# Altium integrated library TI Power Management Battery Management.IntLib: 950 symbols (part 42 of 48)
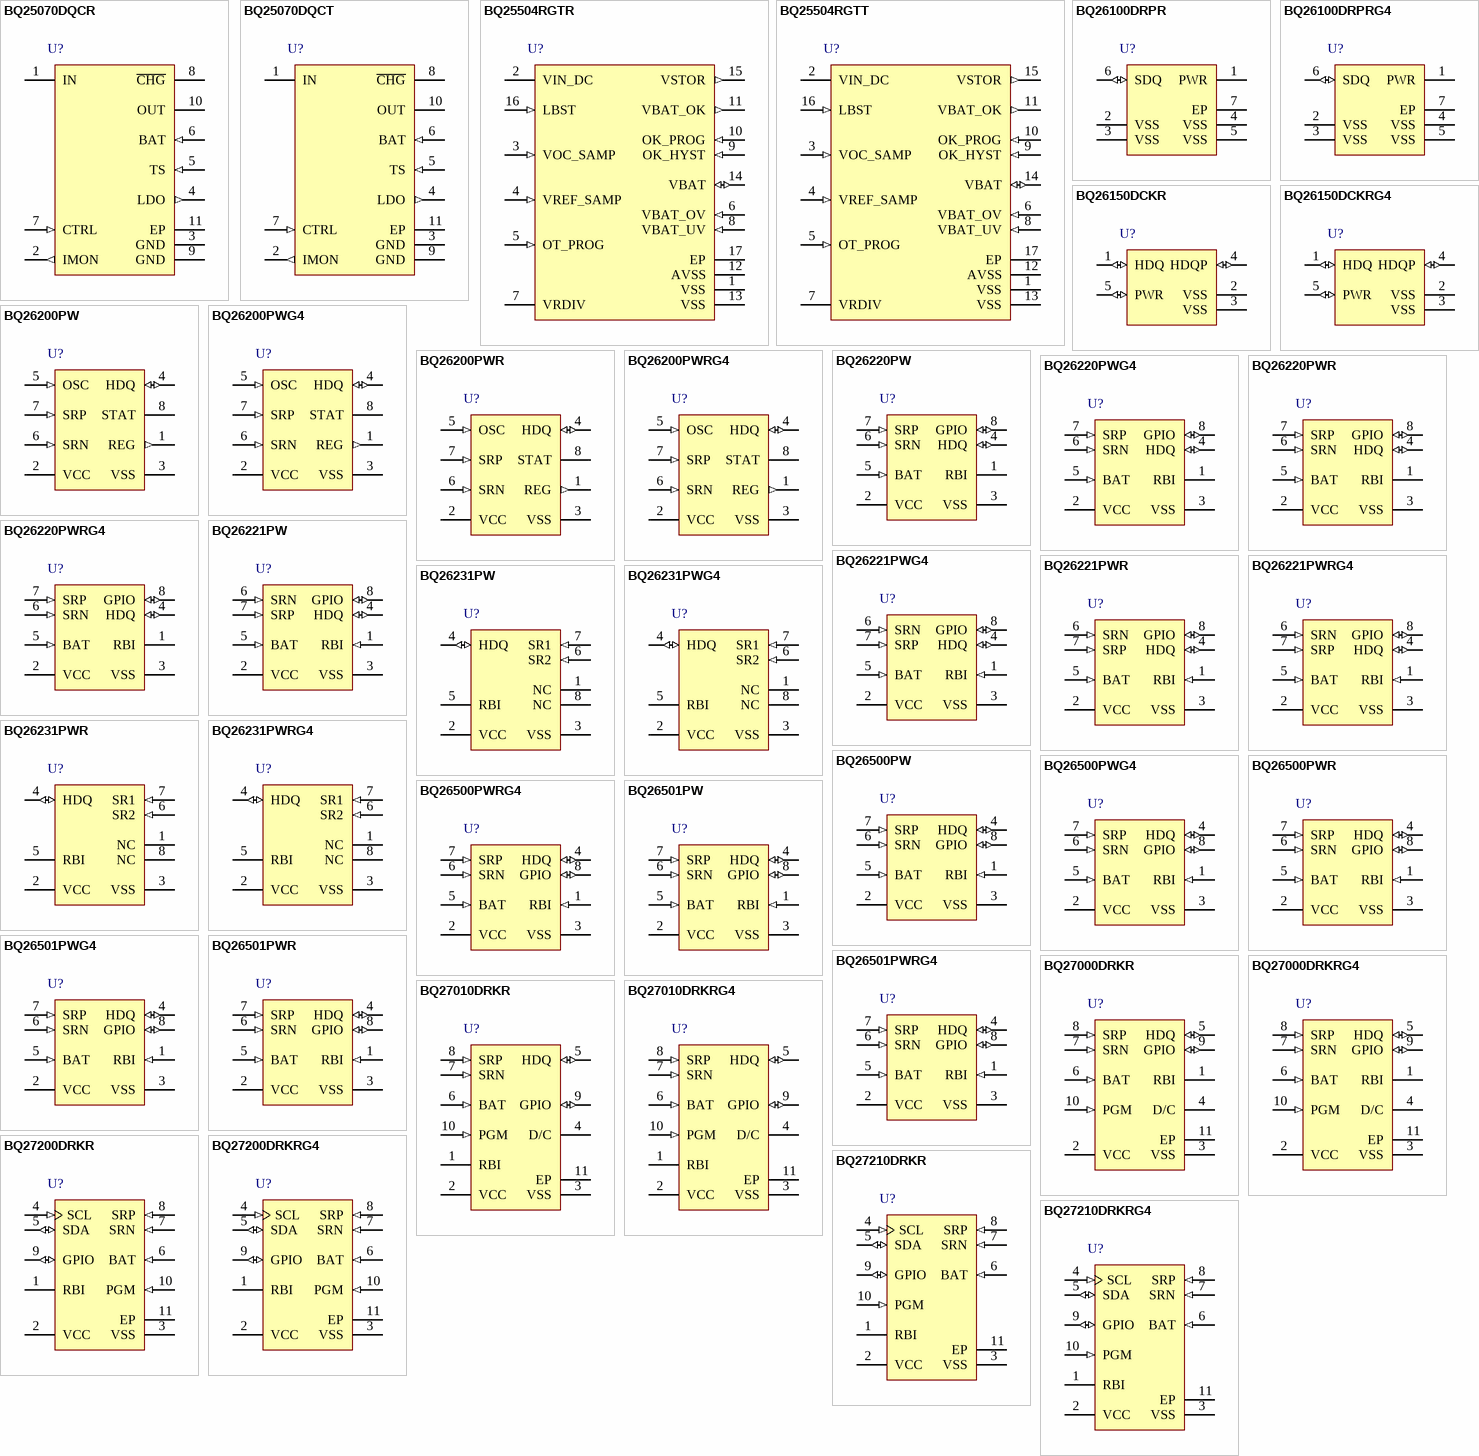
[diagram p75: symbols BQ25070DQCR to BQ27210DRKRG4]

## BQ26231PW
designator U?
Cost-Efficient Coulomb Counter for Battery Capacity Monitoring In Embedded Portable Applications, -20 to 70 degC, 8-pin TSSOP (PW), Green (RoHS & no Sb/Br); PartNumber: BQ26231PW; Manufacturer: Texas Instruments; Lead Acid: Y; Over Voltage Protection: N; SubFamily: Battery Fuel Gauge; DatasheetVersion: SLUS491; PackageVersion: revG, Feb-2011; PackageReference: PW8; PackageDescription: 8-Pin Plastic Thin Small Outline Package 3 x 4.4 mm Body ,0.65 mm Pitch; Supplier 1: Digi-Key; Supplier Part Number 1: 296-12269-5-ND; Supplier Part Number 3: 24M0809; Eco-Plan: Green (RoHS & no Sb/Br); Li-Ion: Y; Li-Polymer: Y; NiCd: Y; NiMH: Y; Mounting Technology: Surface Mount; Code_JEDEC: MO-153; ComponentLink1Description: Datasheet; ComponentLink1URL: http://www.ti.com/general/docs/lit/getliterature.tsp?genericPartNumber=BQ26231&fileType=pdf
footprint PW8_N (TSOP, 8-Leads, Body 3x4.4mm, Pitch 0.65mm, IPC Medium Density)
footprint PW8_L (TSOP, 8-Leads, Body 3x4.4mm, Pitch 0.65mm, IPC High Density)
footprint PW8_M (TSOP, 8-Leads, Body 3x4.4mm, Pitch 0.65mm, IPC Low Density)
pins: 1 NC "No connect. This pin must be left floating.", 2 VCC (power) "Supply voltage", 3 VSS (power) "Ground", 4 HDQ (io) "Single-wire HDQ interface", 5 RBI (power) "Register backup input", 6 SR2 (in) "Current sense input 1", 7 SR1 (in) "Current sense input 2", 8 NC "No connect. This pin must be left floating."

## BQ26231PWG4
designator U?
Cost-Efficient Coulomb Counter for Battery Capacity Monitoring In Embedded Portable Applications, -20 to 70 degC, 8-pin TSSOP (PW), Green (RoHS & no Sb/Br); PartNumber: BQ26231PWG4; Manufacturer: Texas Instruments; Lead Acid: Y; Over Voltage Protection: N; SubFamily: Battery Fuel Gauge; DatasheetVersion: SLUS491; PackageVersion: revG, Feb-2011; PackageReference: PW8; PackageDescription: 8-Pin Plastic Thin Small Outline Package 3 x 4.4 mm Body ,0.65 mm Pitch; Supplier 1: Digi-Key; Supplier Part Number 1: BQ26231PWG4-ND; Supplier Part Number 3: 595-BQ26231PWG4; Eco-Plan: Green (RoHS & no Sb/Br); Li-Ion: Y; Li-Polymer: Y; NiCd: Y; NiMH: Y; Mounting Technology: Surface Mount; Code_JEDEC: MO-153; ComponentLink1Description: Datasheet; ComponentLink1URL: http://www.ti.com/general/docs/lit/getliterature.tsp?genericPartNumber=BQ26231&fileType=pdf
footprint PW8_N (TSOP, 8-Leads, Body 3x4.4mm, Pitch 0.65mm, IPC Medium Density)
footprint PW8_L (TSOP, 8-Leads, Body 3x4.4mm, Pitch 0.65mm, IPC High Density)
footprint PW8_M (TSOP, 8-Leads, Body 3x4.4mm, Pitch 0.65mm, IPC Low Density)
pins: 1 NC "No connect. This pin must be left floating.", 2 VCC (power) "Supply voltage", 3 VSS (power) "Ground", 4 HDQ (io) "Single-wire HDQ interface", 5 RBI (power) "Register backup input", 6 SR2 (in) "Current sense input 1", 7 SR1 (in) "Current sense input 2", 8 NC "No connect. This pin must be left floating."

## BQ26231PWR
designator U?
Cost-Efficient Coulomb Counter for Battery Capacity Monitoring In Embedded Portable Applications, -20 to 70 degC, 8-pin TSSOP (PW), Green (RoHS & no Sb/Br); PartNumber: BQ26231PWR; Manufacturer: Texas Instruments; Lead Acid: Y; Over Voltage Protection: N; SubFamily: Battery Fuel Gauge; DatasheetVersion: SLUS491; PackageVersion: revG, Feb-2011; PackageReference: PW8; PackageDescription: 8-Pin Plastic Thin Small Outline Package 3 x 4.4 mm Body ,0.65 mm Pitch; Supplier 1: Digi-Key; Supplier Part Number 1: BQ26231PWR-ND; Supplier Part Number 3: 595-BQ26231PWR; Eco-Plan: Green (RoHS & no Sb/Br); Li-Ion: Y; Li-Polymer: Y; NiCd: Y; NiMH: Y; Mounting Technology: Surface Mount; Code_JEDEC: MO-153; ComponentLink1Description: Datasheet; ComponentLink1URL: http://www.ti.com/general/docs/lit/getliterature.tsp?genericPartNumber=BQ26231&fileType=pdf
footprint PW8_N (TSOP, 8-Leads, Body 3x4.4mm, Pitch 0.65mm, IPC Medium Density)
footprint PW8_L (TSOP, 8-Leads, Body 3x4.4mm, Pitch 0.65mm, IPC High Density)
footprint PW8_M (TSOP, 8-Leads, Body 3x4.4mm, Pitch 0.65mm, IPC Low Density)
pins: 1 NC "No connect. This pin must be left floating.", 2 VCC (power) "Supply voltage", 3 VSS (power) "Ground", 4 HDQ (io) "Single-wire HDQ interface", 5 RBI (power) "Register backup input", 6 SR2 (in) "Current sense input 1", 7 SR1 (in) "Current sense input 2", 8 NC "No connect. This pin must be left floating."

## BQ26231PWRG4
designator U?
Cost-Efficient Coulomb Counter for Battery Capacity Monitoring In Embedded Portable Applications, -20 to 70 degC, 8-pin TSSOP (PW), Green (RoHS & no Sb/Br); PartNumber: BQ26231PWRG4; Manufacturer: Texas Instruments; Lead Acid: Y; Over Voltage Protection: N; SubFamily: Battery Fuel Gauge; DatasheetVersion: SLUS491; PackageVersion: revG, Feb-2011; PackageReference: PW8; PackageDescription: 8-Pin Plastic Thin Small Outline Package 3 x 4.4 mm Body ,0.65 mm Pitch; Supplier 1: Digi-Key; Supplier Part Number 1: BQ26231PWRG4-ND; Supplier Part Number 3: 595-BQ26231PWRG4; Eco-Plan: Green (RoHS & no Sb/Br); Li-Ion: Y; Li-Polymer: Y; NiCd: Y; NiMH: Y; Mounting Technology: Surface Mount; Code_JEDEC: MO-153; ComponentLink1Description: Datasheet; ComponentLink1URL: http://www.ti.com/general/docs/lit/getliterature.tsp?genericPartNumber=BQ26231&fileType=pdf
footprint PW8_N (TSOP, 8-Leads, Body 3x4.4mm, Pitch 0.65mm, IPC Medium Density)
footprint PW8_L (TSOP, 8-Leads, Body 3x4.4mm, Pitch 0.65mm, IPC High Density)
footprint PW8_M (TSOP, 8-Leads, Body 3x4.4mm, Pitch 0.65mm, IPC Low Density)
pins: 1 NC "No connect. This pin must be left floating.", 2 VCC (power) "Supply voltage", 3 VSS (power) "Ground", 4 HDQ (io) "Single-wire HDQ interface", 5 RBI (power) "Register backup input", 6 SR2 (in) "Current sense input 1", 7 SR1 (in) "Current sense input 2", 8 NC "No connect. This pin must be left floating."

## BQ26500PW
designator U?
Complete Battery Fuel Gauge for One and Two Cell Li-Ion Applications, 0 to 70 degC, 8-pin TSSOP (PW), Green (RoHS & no Sb/Br); PartNumber: BQ26500PW; Manufacturer: Texas Instruments; Lead Acid: N; DatasheetVersion: SLUS567A; PackageVersion: revG, Feb-2011; PackageReference: PW8; PackageDescription: 8-Pin Plastic Thin Small Outline Package 3 x 4.4 mm Body ,0.65 mm Pitch; Supplier 1: Digi-Key; Supplier Part Number 1: 296-15848-5-ND; Supplier Part Number 3: 595-BQ26500PW; Eco-Plan: Green (RoHS & no Sb/Br); Li-Ion: N; Li-Polymer: N; NiCd: N; NiMH: N; Over Voltage Protection: N; SubFamily: Battery Fuel Gauge; Mounting Technology: Surface Mount; Code_JEDEC: MO-153; ComponentLink1Description: Datasheet; ComponentLink1URL: http://www.ti.com/general/docs/lit/getliterature.tsp?genericPartNumber=BQ26500&fileType=pdf
footprint PW8_N (TSOP, 8-Leads, Body 3x4.4mm, Pitch 0.65mm, IPC Medium Density)
footprint PW8_L (TSOP, 8-Leads, Body 3x4.4mm, Pitch 0.65mm, IPC High Density)
footprint PW8_M (TSOP, 8-Leads, Body 3x4.4mm, Pitch 0.65mm, IPC Low Density)
pins: 1 RBI (in) "Register back-up input", 2 VCC (power) "VCC supply input", 3 VSS (power) "Ground input", 4 HDQ (io) "Single-wire HDQ serial interface", 5 BAT (in) "Battery voltage sense input", 6 SRN (in) "Current sense input (negative)", 7 SRP (in) "Current sense input (positive)", 8 GPIO (io) "General-purpose input/output port"

## BQ26500PWG4
designator U?
Complete Battery Fuel Gauge for One and Two Cell Li-Ion Applications, 0 to 70 degC, 8-pin TSSOP (PW), Green (RoHS & no Sb/Br); PartNumber: BQ26500PWG4; Manufacturer: Texas Instruments; Lead Acid: N; DatasheetVersion: SLUS567A; PackageVersion: revG, Feb-2011; PackageReference: PW8; PackageDescription: 8-Pin Plastic Thin Small Outline Package 3 x 4.4 mm Body ,0.65 mm Pitch; Supplier 1: Digi-Key; Supplier Part Number 1: BQ26500PWG4-ND; Supplier Part Number 3: 595-BQ26500PWG4; Eco-Plan: Green (RoHS & no Sb/Br); Li-Ion: N; Li-Polymer: N; NiCd: N; NiMH: N; Over Voltage Protection: N; SubFamily: Battery Fuel Gauge; Mounting Technology: Surface Mount; Code_JEDEC: MO-153; ComponentLink1Description: Datasheet; ComponentLink1URL: http://www.ti.com/general/docs/lit/getliterature.tsp?genericPartNumber=BQ26500&fileType=pdf
footprint PW8_N (TSOP, 8-Leads, Body 3x4.4mm, Pitch 0.65mm, IPC Medium Density)
footprint PW8_L (TSOP, 8-Leads, Body 3x4.4mm, Pitch 0.65mm, IPC High Density)
footprint PW8_M (TSOP, 8-Leads, Body 3x4.4mm, Pitch 0.65mm, IPC Low Density)
pins: 1 RBI (in) "Register back-up input", 2 VCC (power) "VCC supply input", 3 VSS (power) "Ground input", 4 HDQ (io) "Single-wire HDQ serial interface", 5 BAT (in) "Battery voltage sense input", 6 SRN (in) "Current sense input (negative)", 7 SRP (in) "Current sense input (positive)", 8 GPIO (io) "General-purpose input/output port"

## BQ26500PWR
designator U?
Complete Battery Fuel Gauge for One and Two Cell Li-Ion Applications, 0 to 70 degC, 8-pin TSSOP (PW), Green (RoHS & no Sb/Br); PartNumber: BQ26500PWR; Manufacturer: Texas Instruments; Lead Acid: N; DatasheetVersion: SLUS567A; PackageVersion: revG, Feb-2011; PackageReference: PW8; PackageDescription: 8-Pin Plastic Thin Small Outline Package 3 x 4.4 mm Body ,0.65 mm Pitch; Supplier 1: Digi-Key; Supplier Part Number 1: 296-16775-2-ND; Supplier Part Number 3: 296-16775-6-ND; Eco-Plan: Green (RoHS & no Sb/Br); Li-Ion: N; Li-Polymer: N; NiCd: N; NiMH: N; Over Voltage Protection: N; SubFamily: Battery Fuel Gauge; Mounting Technology: Surface Mount; Code_JEDEC: MO-153; ComponentLink1Description: Datasheet; ComponentLink1URL: http://www.ti.com/general/docs/lit/getliterature.tsp?genericPartNumber=BQ26500&fileType=pdf
footprint PW8_N (TSOP, 8-Leads, Body 3x4.4mm, Pitch 0.65mm, IPC Medium Density)
footprint PW8_L (TSOP, 8-Leads, Body 3x4.4mm, Pitch 0.65mm, IPC High Density)
footprint PW8_M (TSOP, 8-Leads, Body 3x4.4mm, Pitch 0.65mm, IPC Low Density)
pins: 1 RBI (in) "Register back-up input", 2 VCC (power) "VCC supply input", 3 VSS (power) "Ground input", 4 HDQ (io) "Single-wire HDQ serial interface", 5 BAT (in) "Battery voltage sense input", 6 SRN (in) "Current sense input (negative)", 7 SRP (in) "Current sense input (positive)", 8 GPIO (io) "General-purpose input/output port"

## BQ26500PWRG4
designator U?
Complete Battery Fuel Gauge for One and Two Cell Li-Ion Applications, 0 to 70 degC, 8-pin TSSOP (PW), Green (RoHS & no Sb/Br); PartNumber: BQ26500PWRG4; Manufacturer: Texas Instruments; Lead Acid: N; DatasheetVersion: SLUS567A; PackageVersion: revG, Feb-2011; PackageReference: PW8; PackageDescription: 8-Pin Plastic Thin Small Outline Package 3 x 4.4 mm Body ,0.65 mm Pitch; Supplier 1: Digi-Key; Supplier Part Number 1: BQ26500PWRG4-ND; Supplier Part Number 3: 595-BQ26500PWRG4; Eco-Plan: Green (RoHS & no Sb/Br); Li-Ion: N; Li-Polymer: N; NiCd: N; NiMH: N; Over Voltage Protection: N; SubFamily: Battery Fuel Gauge; Mounting Technology: Surface Mount; Code_JEDEC: MO-153; ComponentLink1Description: Datasheet; ComponentLink1URL: http://www.ti.com/general/docs/lit/getliterature.tsp?genericPartNumber=BQ26500&fileType=pdf
footprint PW8_N (TSOP, 8-Leads, Body 3x4.4mm, Pitch 0.65mm, IPC Medium Density)
footprint PW8_L (TSOP, 8-Leads, Body 3x4.4mm, Pitch 0.65mm, IPC High Density)
footprint PW8_M (TSOP, 8-Leads, Body 3x4.4mm, Pitch 0.65mm, IPC Low Density)
pins: 1 RBI (in) "Register back-up input", 2 VCC (power) "VCC supply input", 3 VSS (power) "Ground input", 4 HDQ (io) "Single-wire HDQ serial interface", 5 BAT (in) "Battery voltage sense input", 6 SRN (in) "Current sense input (negative)", 7 SRP (in) "Current sense input (positive)", 8 GPIO (io) "General-purpose input/output port"

## BQ26501PW
designator U?
OMAP Compatible Fuel Gauge for 1 & 2 Cell Li-Ion, -20 to 70 degC, 8-pin TSSOP (PW), Green (RoHS & no Sb/Br); PartNumber: BQ26501PW; Manufacturer: Texas Instruments; Lead Acid: N; SubFamily: Battery Fuel Gauge; DatasheetVersion: SLUS586B; PackageVersion: revG, Feb-2011; PackageReference: PW8; PackageDescription: 8-Pin Plastic Thin Small Outline Package 3 x 4.4 mm Body ,0.65 mm Pitch; Supplier 1: Digi-Key; Supplier Part Number 1: 296-16925-5-ND; Supplier Part Number 3: 595-BQ26501PW; Eco-Plan: Green (RoHS & no Sb/Br); Li-Ion: N; Li-Polymer: N; NiCd: N; NiMH: N; Over Voltage Protection: N; Mounting Technology: Surface Mount; Code_JEDEC: MO-153; ComponentLink1Description: Datasheet; ComponentLink1URL: http://www.ti.com/general/docs/lit/getliterature.tsp?genericPartNumber=BQ26501&fileType=pdf
footprint PW8_N (TSOP, 8-Leads, Body 3x4.4mm, Pitch 0.65mm, IPC Medium Density)
footprint PW8_L (TSOP, 8-Leads, Body 3x4.4mm, Pitch 0.65mm, IPC High Density)
footprint PW8_M (TSOP, 8-Leads, Body 3x4.4mm, Pitch 0.65mm, IPC Low Density)
pins: 1 RBI (in) "Register back-up input", 2 VCC (power) "VCC supply input", 3 VSS (power) "Ground input", 4 HDQ (io) "Single-wire HDQ serial interface", 5 BAT (in) "Battery voltage sense input", 6 SRN (in) "Current sense input (negative)", 7 SRP (in) "Current sense input (positive)", 8 GPIO (io) "General-purpose input/output port"

## BQ26501PWG4
designator U?
OMAP Compatible Fuel Gauge for 1 & 2 Cell Li-Ion, -20 to 70 degC, 8-pin TSSOP (PW), Green (RoHS & no Sb/Br); PartNumber: BQ26501PWG4; Manufacturer: Texas Instruments; Lead Acid: N; SubFamily: Battery Fuel Gauge; DatasheetVersion: SLUS586B; PackageVersion: revG, Feb-2011; PackageReference: PW8; PackageDescription: 8-Pin Plastic Thin Small Outline Package 3 x 4.4 mm Body ,0.65 mm Pitch; Supplier 1: Digi-Key; Supplier Part Number 1: BQ26501PWG4-ND; Supplier Part Number 3: 595-BQ26501PWG4; Eco-Plan: Green (RoHS & no Sb/Br); Li-Ion: N; Li-Polymer: N; NiCd: N; NiMH: N; Over Voltage Protection: N; Mounting Technology: Surface Mount; Code_JEDEC: MO-153; ComponentLink1Description: Datasheet; ComponentLink1URL: http://www.ti.com/general/docs/lit/getliterature.tsp?genericPartNumber=BQ26501&fileType=pdf
footprint PW8_N (TSOP, 8-Leads, Body 3x4.4mm, Pitch 0.65mm, IPC Medium Density)
footprint PW8_L (TSOP, 8-Leads, Body 3x4.4mm, Pitch 0.65mm, IPC High Density)
footprint PW8_M (TSOP, 8-Leads, Body 3x4.4mm, Pitch 0.65mm, IPC Low Density)
pins: 1 RBI (in) "Register back-up input", 2 VCC (power) "VCC supply input", 3 VSS (power) "Ground input", 4 HDQ (io) "Single-wire HDQ serial interface", 5 BAT (in) "Battery voltage sense input", 6 SRN (in) "Current sense input (negative)", 7 SRP (in) "Current sense input (positive)", 8 GPIO (io) "General-purpose input/output port"

## BQ26501PWR
designator U?
OMAP Compatible Fuel Gauge for 1 & 2 Cell Li-Ion, -20 to 70 degC, 8-pin TSSOP (PW), Green (RoHS & no Sb/Br); PartNumber: BQ26501PWR; Manufacturer: Texas Instruments; Lead Acid: N; SubFamily: Battery Fuel Gauge; DatasheetVersion: SLUS586B; PackageVersion: revG, Feb-2011; PackageReference: PW8; PackageDescription: 8-Pin Plastic Thin Small Outline Package 3 x 4.4 mm Body ,0.65 mm Pitch; Supplier 1: Digi-Key; Supplier Part Number 1: 296-31471-2-ND; Supplier Part Number 3: 296-31471-6-ND; Eco-Plan: Green (RoHS & no Sb/Br); Li-Ion: N; Li-Polymer: N; NiCd: N; NiMH: N; Over Voltage Protection: N; Mounting Technology: Surface Mount; Code_JEDEC: MO-153; ComponentLink1Description: Datasheet; ComponentLink1URL: http://www.ti.com/general/docs/lit/getliterature.tsp?genericPartNumber=BQ26501&fileType=pdf
footprint PW8_N (TSOP, 8-Leads, Body 3x4.4mm, Pitch 0.65mm, IPC Medium Density)
footprint PW8_L (TSOP, 8-Leads, Body 3x4.4mm, Pitch 0.65mm, IPC High Density)
footprint PW8_M (TSOP, 8-Leads, Body 3x4.4mm, Pitch 0.65mm, IPC Low Density)
pins: 1 RBI (in) "Register back-up input", 2 VCC (power) "VCC supply input", 3 VSS (power) "Ground input", 4 HDQ (io) "Single-wire HDQ serial interface", 5 BAT (in) "Battery voltage sense input", 6 SRN (in) "Current sense input (negative)", 7 SRP (in) "Current sense input (positive)", 8 GPIO (io) "General-purpose input/output port"

## BQ26501PWRG4
designator U?
OMAP Compatible Fuel Gauge for 1 & 2 Cell Li-Ion, -20 to 70 degC, 8-pin TSSOP (PW), Green (RoHS & no Sb/Br); PartNumber: BQ26501PWRG4; Manufacturer: Texas Instruments; Lead Acid: N; SubFamily: Battery Fuel Gauge; DatasheetVersion: SLUS586B; PackageVersion: revG, Feb-2011; PackageReference: PW8; PackageDescription: 8-Pin Plastic Thin Small Outline Package 3 x 4.4 mm Body ,0.65 mm Pitch; Supplier 1: Digi-Key; Supplier Part Number 1: BQ26501PWRG4-ND; Supplier Part Number 3: 595-BQ26501PWRG4; Eco-Plan: Green (RoHS & no Sb/Br); Li-Ion: N; Li-Polymer: N; NiCd: N; NiMH: N; Over Voltage Protection: N; Mounting Technology: Surface Mount; Code_JEDEC: MO-153; ComponentLink1Description: Datasheet; ComponentLink1URL: http://www.ti.com/general/docs/lit/getliterature.tsp?genericPartNumber=BQ26501&fileType=pdf
footprint PW8_N (TSOP, 8-Leads, Body 3x4.4mm, Pitch 0.65mm, IPC Medium Density)
footprint PW8_L (TSOP, 8-Leads, Body 3x4.4mm, Pitch 0.65mm, IPC High Density)
footprint PW8_M (TSOP, 8-Leads, Body 3x4.4mm, Pitch 0.65mm, IPC Low Density)
pins: 1 RBI (in) "Register back-up input", 2 VCC (power) "VCC supply input", 3 VSS (power) "Ground input", 4 HDQ (io) "Single-wire HDQ serial interface", 5 BAT (in) "Battery voltage sense input", 6 SRN (in) "Current sense input (negative)", 7 SRP (in) "Current sense input (positive)", 8 GPIO (io) "General-purpose input/output port"

## BQ27000DRKR
designator U?
Single-Cell Li-Ion and Li-Pol Battery Gas Gauge IC, -20 to 70 degC, 10-pin VSON (DRK), Green (RoHS & no Sb/Br); PartNumber: BQ27000DRKR; Manufacturer: Texas Instruments; Lead Acid: N; Li-Ion: Y; SubFamily: Battery Fuel Gauge; DatasheetVersion: SLUS556D; PackageVersion: revD, Feb-2011; PackageReference: DRK10-2050X2650TP; PackageDescription: 10-Pin Plastic Small Outline No-Lead, 4 x 3 x 1 mm Body, 0.5 mm Pitch, Exposed Pad; Supplier 1: Digi-Key; Supplier Part Number 1: 296-17428-2-ND; Supplier Part Number 3: 296-17428-6-ND; Eco-Plan: Green (RoHS & no Sb/Br); Li-Polymer: N; NiCd: N; NiMH: N; Over Voltage Protection: N; Mounting Technology: Surface Mount; ComponentLink1Description: Datasheet; ComponentLink1URL: http://www.ti.com/general/docs/lit/getliterature.tsp?genericPartNumber=BQ27000&fileType=pdf
footprint DRK10-2050X2650TP (SON, 10-Leads, Body 4x3mm, Pitch 0.5mm, Thermal Pad 2.05x2.65mm, TI Recommended)
pins: 1 RBI (power) "Register back-up input", 2 VCC (power) "VCC supply input", 3 VSS (power) "Ground input", 4 D/C "Do not connect. Must be left floating or tied to VSS", 5 HDQ (io) "Single wire HDQ serial interface", 6 BAT (in) "Battery voltage sense input", 7 SRN (in) "Current sense input (negative)", 8 SRP (in) "Current sense input (positive)", 9 GPIO (io) "General purpose input/output", 10 PGM (in) "EEPROM programming voltage input", 11 EP (power) "Ground shield"

## BQ27000DRKRG4
designator U?
Single-Cell Li-Ion and Li-Pol Battery Gas Gauge IC, -20 to 70 degC, 10-pin VSON (DRK), Green (RoHS & no Sb/Br); PartNumber: BQ27000DRKRG4; Manufacturer: Texas Instruments; Lead Acid: N; Li-Ion: Y; SubFamily: Battery Fuel Gauge; DatasheetVersion: SLUS556D; PackageVersion: revD, Feb-2011; PackageReference: DRK10-2050X2650TP; PackageDescription: 10-Pin Plastic Small Outline No-Lead, 4 x 3 x 1 mm Body, 0.5 mm Pitch, Exposed Pad; Supplier 1: Digi-Key; Supplier Part Number 1: BQ27000DRKRG4-ND; Supplier Part Number 3: 595-BQ27000DRKRG4; Eco-Plan: Green (RoHS & no Sb/Br); Li-Polymer: N; NiCd: N; NiMH: N; Over Voltage Protection: N; Mounting Technology: Surface Mount; ComponentLink1Description: Datasheet; ComponentLink1URL: http://www.ti.com/general/docs/lit/getliterature.tsp?genericPartNumber=BQ27000&fileType=pdf
footprint DRK10-2050X2650TP (SON, 10-Leads, Body 4x3mm, Pitch 0.5mm, Thermal Pad 2.05x2.65mm, TI Recommended)
pins: 1 RBI (power) "Register back-up input", 2 VCC (power) "VCC supply input", 3 VSS (power) "Ground input", 4 D/C "Do not connect. Must be left floating or tied to VSS", 5 HDQ (io) "Single wire HDQ serial interface", 6 BAT (in) "Battery voltage sense input", 7 SRN (in) "Current sense input (negative)", 8 SRP (in) "Current sense input (positive)", 9 GPIO (io) "General purpose input/output", 10 PGM (in) "EEPROM programming voltage input", 11 EP (power) "Ground shield"

## BQ27010DRKR
designator U?
Li-Ion and Li-Pol Battery Gas Gauge IC for Portable Applications (bqJUNIOR), 10-pin VSON (DRK), Green (RoHS & no Sb/Br); PartNumber: BQ27010DRKR; Manufacturer: Texas Instruments; Lead Acid: N; Li-Ion: Y; SubFamily: Battery Fuel Gauge; DatasheetVersion: SLUS707B; PackageVersion: revD, Feb-2011; PackageReference: DRK10-2050X2650TP; PackageDescription: 10-Pin Plastic Small Outline No-Lead, 4 x 3 x 1 mm Body, 0.5 mm Pitch, Exposed Pad; Supplier 1: Digi-Key; Supplier Part Number 1: 296-20634-2-ND; Supplier Part Number 3: 296-20634-6-ND; Eco-Plan: Green (RoHS & no Sb/Br); Li-Polymer: Y; NiCd: N; NiMH: N; Over Voltage Protection: N; Mounting Technology: Surface Mount; ComponentLink1Description: Datasheet; ComponentLink1URL: http://www.ti.com/general/docs/lit/getliterature.tsp?genericPartNumber=BQ27010&fileType=pdf
footprint DRK10-2050X2650TP (SON, 10-Leads, Body 4x3mm, Pitch 0.5mm, Thermal Pad 2.05x2.65mm, TI Recommended)
pins: 1 RBI (power) "Register back-up input", 2 VCC (power) "VCC supply input", 3 VSS (power) "Ground input", 4 D/C "Do not connect. Must be left floating or tied to VSS", 5 HDQ (io) "Single wire HDQ serial interface", 6 BAT (in) "Battery voltage sense input", 7 SRN (in) "Current sense input (negative)", 8 SRP (in) "Current sense input (positive)", 9 GPIO (io) "General purpose input/output", 10 PGM (in) "EEPROM programming voltage input", 11 EP (power) "Ground shield"

## BQ27010DRKRG4
designator U?
Li-Ion and Li-Pol Battery Gas Gauge IC for Portable Applications (bqJUNIOR), 10-pin VSON (DRK), Green (RoHS & no Sb/Br); PartNumber: BQ27010DRKRG4; Manufacturer: Texas Instruments; Lead Acid: N; Li-Ion: Y; SubFamily: Battery Fuel Gauge; DatasheetVersion: SLUS707B; PackageVersion: revD, Feb-2011; PackageReference: DRK10-2050X2650TP; PackageDescription: 10-Pin Plastic Small Outline No-Lead, 4 x 3 x 1 mm Body, 0.5 mm Pitch, Exposed Pad; Supplier 1: Digi-Key; Supplier Part Number 1: BQ27010DRKRG4-ND; Supplier Part Number 3: 595-BQ27010DRKRG4; Eco-Plan: Green (RoHS & no Sb/Br); Li-Polymer: Y; NiCd: N; NiMH: N; Over Voltage Protection: N; Mounting Technology: Surface Mount; ComponentLink1Description: Datasheet; ComponentLink1URL: http://www.ti.com/general/docs/lit/getliterature.tsp?genericPartNumber=BQ27010&fileType=pdf
footprint DRK10-2050X2650TP (SON, 10-Leads, Body 4x3mm, Pitch 0.5mm, Thermal Pad 2.05x2.65mm, TI Recommended)
pins: 1 RBI (power) "Register back-up input", 2 VCC (power) "VCC supply input", 3 VSS (power) "Ground input", 4 D/C "Do not connect. Must be left floating or tied to VSS", 5 HDQ (io) "Single wire HDQ serial interface", 6 BAT (in) "Battery voltage sense input", 7 SRN (in) "Current sense input (negative)", 8 SRP (in) "Current sense input (positive)", 9 GPIO (io) "General purpose input/output", 10 PGM (in) "EEPROM programming voltage input", 11 EP (power) "Ground shield"

## BQ27200DRKR
designator U?
Single-Cell Li-Ion and Li-Pol Battery Gas Gauge IC with I2C Interface, -20 to 70 degC, 10-pin VSON (DRK), Green (RoHS & no Sb/Br); PartNumber: BQ27200DRKR; Manufacturer: Texas Instruments; Lead Acid: N; Li-Ion: Y; SubFamily: Battery Fuel Gauge; DatasheetVersion: SLUS556D; PackageVersion: revD, Feb-2011; PackageReference: DRK10-2050X2650TP; PackageDescription: 10-Pin Plastic Small Outline No-Lead, 4 x 3 x 1 mm Body, 0.5 mm Pitch, Exposed Pad; Supplier 1: Digi-Key; Supplier Part Number 1: 296-17521-2-ND; Supplier Part Number 3: 296-17521-6-ND; Eco-Plan: Green (RoHS & no Sb/Br); Li-Polymer: Y; NiCd: N; NiMH: N; Over Voltage Protection: N; Mounting Technology: Surface Mount; ComponentLink1Description: Datasheet; ComponentLink1URL: http://www.ti.com/general/docs/lit/getliterature.tsp?genericPartNumber=BQ27200&fileType=pdf
footprint DRK10-2050X2650TP (SON, 10-Leads, Body 4x3mm, Pitch 0.5mm, Thermal Pad 2.05x2.65mm, TI Recommended)
pins: 1 RBI (power) "Register back-up input", 2 VCC (power) "VCC supply input", 3 VSS (power) "Ground input", 4 SCL (in) "Serial clock input (I2C)", 5 SDA (io) "Serial data input (I2C)", 6 BAT (in) "Battery voltage sense input", 7 SRN (in) "Current sense input (negative)", 8 SRP (in) "Current sense input (positive)", 9 GPIO (io) "General purpose input/output", 10 PGM (in) "EEPROM programming voltage input", 11 EP (power) "Ground shield"

## BQ27200DRKRG4
designator U?
Single-Cell Li-Ion and Li-Pol Battery Gas Gauge IC with I2C Interface, -20 to 70 degC, 10-pin VSON (DRK), Green (RoHS & no Sb/Br); PartNumber: BQ27200DRKRG4; Manufacturer: Texas Instruments; Lead Acid: N; Li-Ion: Y; SubFamily: Battery Fuel Gauge; DatasheetVersion: SLUS556D; PackageVersion: revD, Feb-2011; PackageReference: DRK10-2050X2650TP; PackageDescription: 10-Pin Plastic Small Outline No-Lead, 4 x 3 x 1 mm Body, 0.5 mm Pitch, Exposed Pad; Supplier 1: Digi-Key; Supplier Part Number 1: BQ27200DRKRG4-ND; Supplier Part Number 3: 595-BQ27200DRKRG4; Eco-Plan: Green (RoHS & no Sb/Br); Li-Polymer: Y; NiCd: N; NiMH: N; Over Voltage Protection: N; Mounting Technology: Surface Mount; ComponentLink1Description: Datasheet; ComponentLink1URL: http://www.ti.com/general/docs/lit/getliterature.tsp?genericPartNumber=BQ27200&fileType=pdf
footprint DRK10-2050X2650TP (SON, 10-Leads, Body 4x3mm, Pitch 0.5mm, Thermal Pad 2.05x2.65mm, TI Recommended)
pins: 1 RBI (power) "Register back-up input", 2 VCC (power) "VCC supply input", 3 VSS (power) "Ground input", 4 SCL (in) "Serial clock input (I2C)", 5 SDA (io) "Serial data input (I2C)", 6 BAT (in) "Battery voltage sense input", 7 SRN (in) "Current sense input (negative)", 8 SRP (in) "Current sense input (positive)", 9 GPIO (io) "General purpose input/output", 10 PGM (in) "EEPROM programming voltage input", 11 EP (power) "Ground shield"

## BQ27210DRKR
designator U?
Li-Ion and Li-Pol Battery Gas Gauge IC for Portable Applications (bqJUNIOR), -20 to 70 degC, 10-pin VSON (DRK), Green (RoHS & no Sb/Br); PartNumber: BQ27210DRKR; Manufacturer: Texas Instruments; Lead Acid: N; Li-Ion: Y; SubFamily: Battery Fuel Gauge; DatasheetVersion: SLUS707B; PackageVersion: revD, Feb-2011; PackageReference: DRK10-2050X2650TP; PackageDescription: 10-Pin Plastic Small Outline No-Lead, 4 x 3 x 1 mm Body, 0.5 mm Pitch, Exposed Pad; Supplier 1: Digi-Key; Supplier Part Number 1: 296-21511-2-ND; Supplier Part Number 3: 296-21511-6-ND; Eco-Plan: Green (RoHS & no Sb/Br); Li-Polymer: Y; NiCd: N; NiMH: N; Over Voltage Protection: N; Mounting Technology: Surface Mount; ComponentLink1Description: Datasheet; ComponentLink1URL: http://www.ti.com/general/docs/lit/getliterature.tsp?genericPartNumber=BQ27210&fileType=pdf
footprint DRK10-2050X2650TP (SON, 10-Leads, Body 4x3mm, Pitch 0.5mm, Thermal Pad 2.05x2.65mm, TI Recommended)
pins: 1 RBI (power) "Register back-up input", 2 VCC (power) "VCC supply input", 3 VSS (power) "Ground input", 4 SCL (in) "Serial clock input (I2C)", 5 SDA (io) "Serial data input (I2C)", 6 BAT (in) "Battery voltage sense input", 7 SRN (in) "Current sense input (negative)", 8 SRP (in) "Current sense input (positive)", 9 GPIO (io) "General purpose input/output", 10 PGM (in) "EEPROM programming voltage input", 11 EP (power) "Ground shield"

## BQ27210DRKRG4
designator U?
Li-Ion and Li-Pol Battery Gas Gauge IC for Portable Applications (bqJUNIOR), -20 to 70 degC, 10-pin VSON (DRK), Green (RoHS & no Sb/Br); PartNumber: BQ27210DRKRG4; Manufacturer: Texas Instruments; Lead Acid: N; Li-Ion: Y; SubFamily: Battery Fuel Gauge; DatasheetVersion: SLUS707B; PackageVersion: revD, Feb-2011; PackageReference: DRK10-2050X2650TP; PackageDescription: 10-Pin Plastic Small Outline No-Lead, 4 x 3 x 1 mm Body, 0.5 mm Pitch, Exposed Pad; Supplier 1: Digi-Key; Supplier Part Number 1: BQ27210DRKRG4-ND; Supplier Part Number 3: 595-BQ27210DRKRG4; Eco-Plan: Green (RoHS & no Sb/Br); Li-Polymer: Y; NiCd: N; NiMH: N; Over Voltage Protection: N; Mounting Technology: Surface Mount; ComponentLink1Description: Datasheet; ComponentLink1URL: http://www.ti.com/general/docs/lit/getliterature.tsp?genericPartNumber=BQ27210&fileType=pdf
footprint DRK10-2050X2650TP (SON, 10-Leads, Body 4x3mm, Pitch 0.5mm, Thermal Pad 2.05x2.65mm, TI Recommended)
pins: 1 RBI (power) "Register back-up input", 2 VCC (power) "VCC supply input", 3 VSS (power) "Ground input", 4 SCL (in) "Serial clock input (I2C)", 5 SDA (io) "Serial data input (I2C)", 6 BAT (in) "Battery voltage sense input", 7 SRN (in) "Current sense input (negative)", 8 SRP (in) "Current sense input (positive)", 9 GPIO (io) "General purpose input/output", 10 PGM (in) "EEPROM programming voltage input", 11 EP (power) "Ground shield"

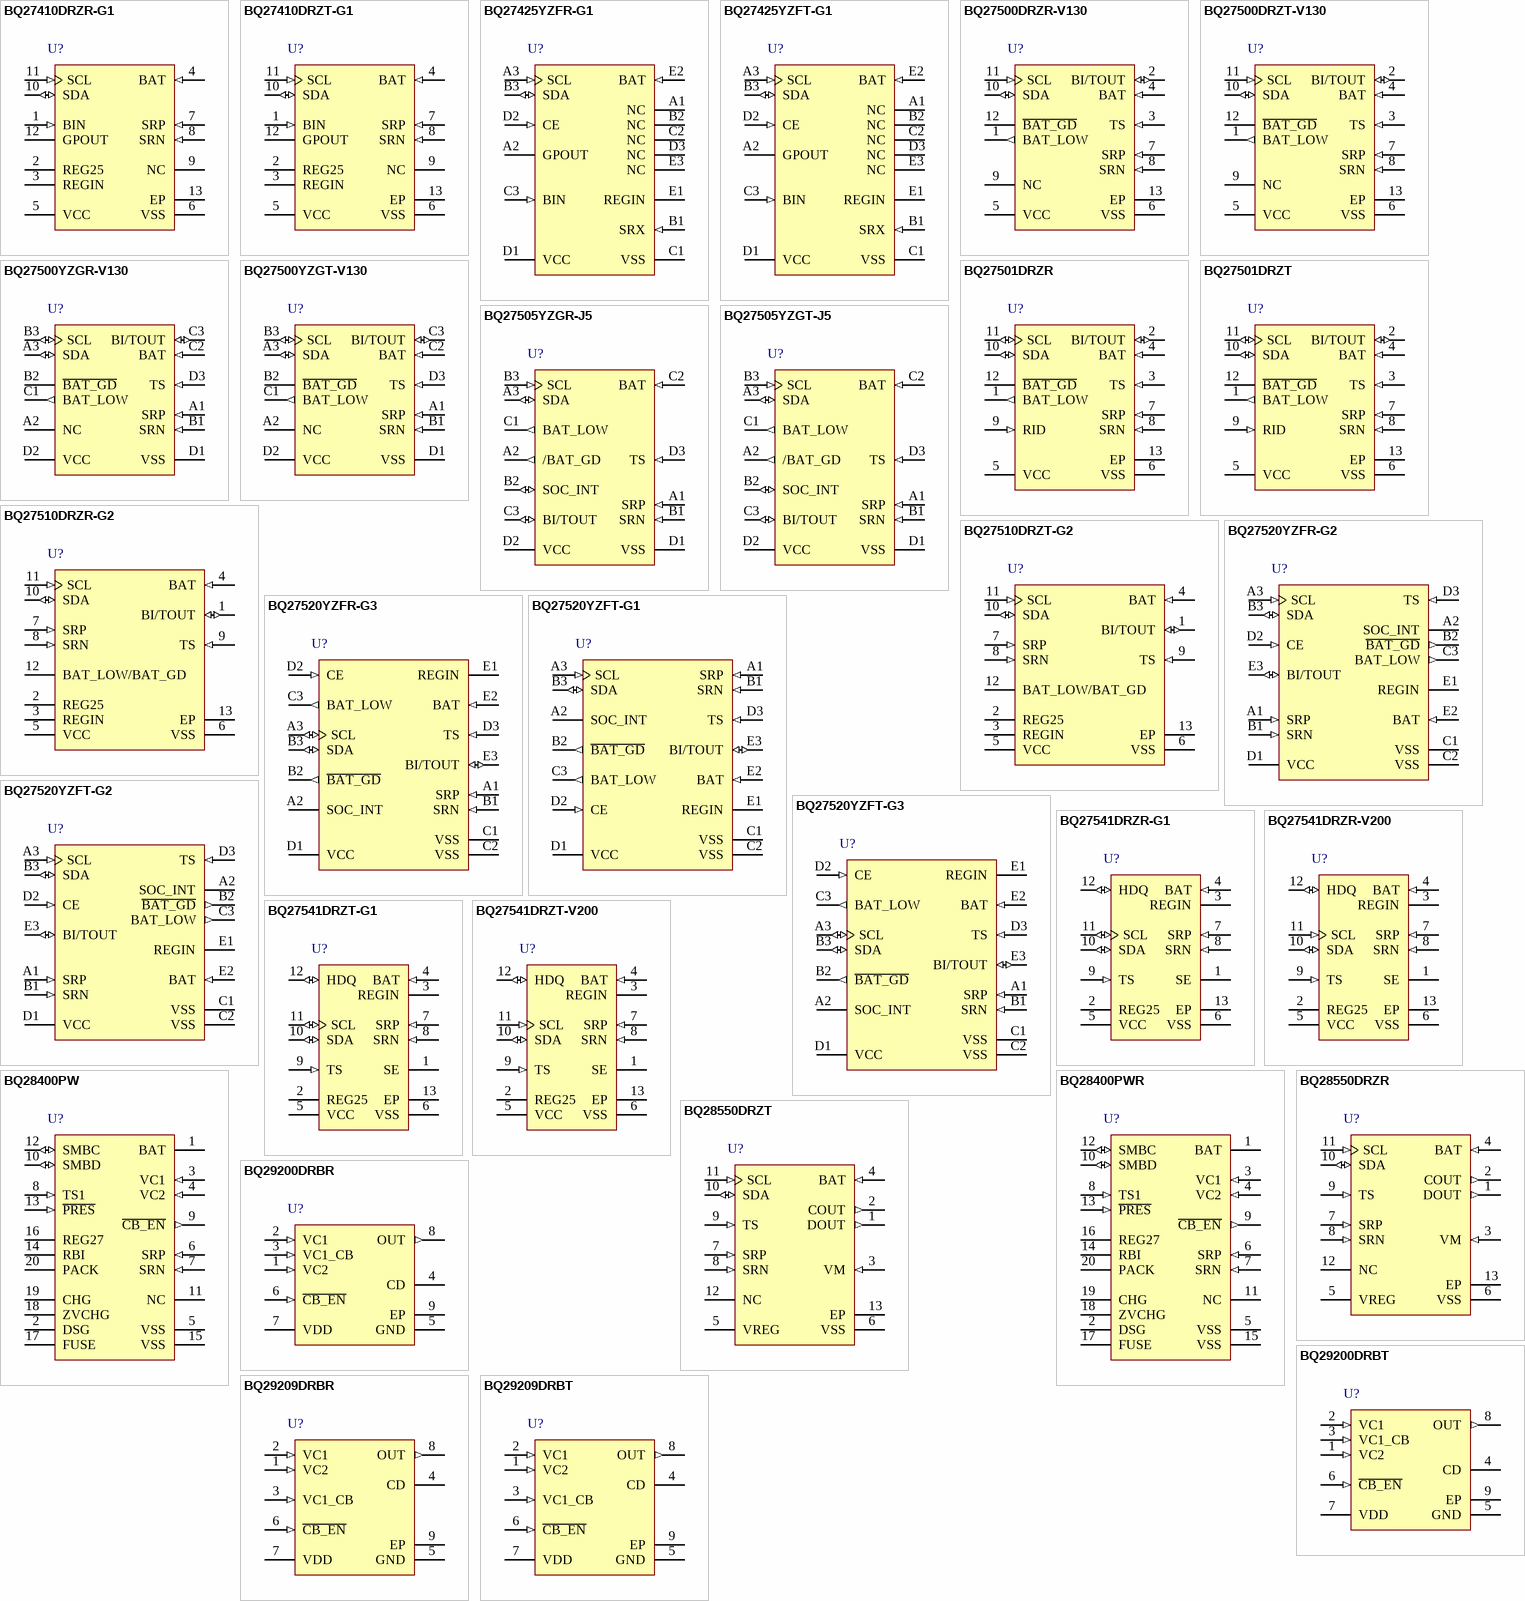
[diagram p29: symbols BQ27410DRZR-G1 to BQ29209DRBT]
